# Altium footprint library AMLB_v1.PcbLib: 147 footprints (part 10 of 10)
Each footprint in its own frame and in the unit in brackets; x right, y up, seen from the top. Pads: shape width x height; smd on the part's side, far side on the other; paste and mask are expansions set on the pad; w line width, h text height; cw(c..) or ccw(c..) is an arc to the next point about the centre after c.
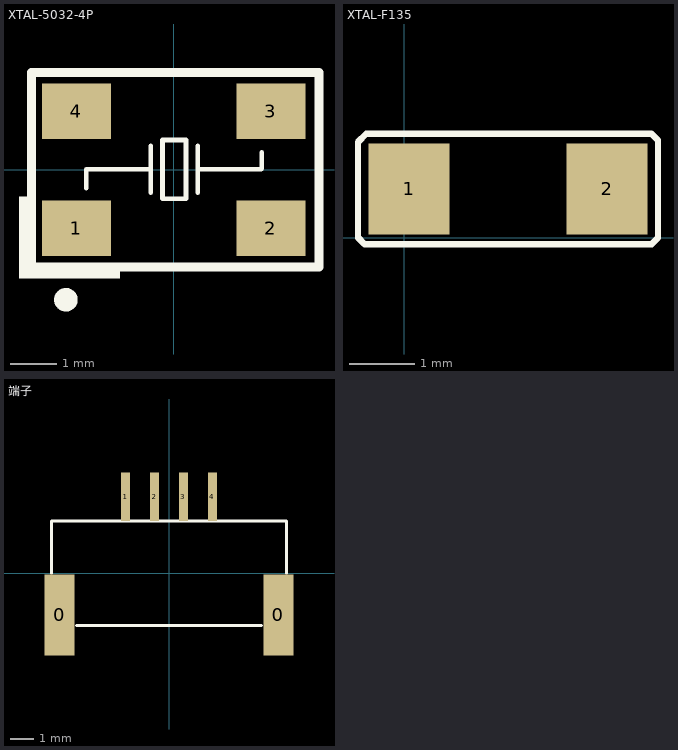
[diagram p9: the footprints below, top view; thin cyan lines are the x and y axes]

## XTAL-5032-4P [mm]
pads (4):
  rect 1.5x1.2 smd: 1(-2.108,-1.27) 2(2.108,-1.27) 3(2.108,1.27) 4(-2.108,1.27)
Top Overlay:
  circle w0.254: c-2.337,-2.819 r0.127
  rectangle: -3.353,-2.362 -3.175,-0.584
  rectangle: -3.175,-2.362 -1.168,-2.108
  lines w0.1: -1.897,-0.406 -1.897,0.008 -0.496,0.008 ; -0.496,-0.5 -0.496,0.516 ; 0.52,-0.5 0.52,0.516 ; 0.52,0.008 1.902,0.008 1.905,0.016 1.905,0.381 ; -0.242,-0.627 0.266,-0.627 0.266,-0.309 0.266,0.326 0.266,0.643 -0.242,0.643 -0.242,-0.627
  lines w0.2: -3.079,-2.108 -3.079,2.108 3.15,2.108 3.15,-2.108 -3.079,-2.108
3D body "User Library-CRYSTALSMD5X32.STEP": height 1, standoff 0, extent -2.5,-1.6 2.5,1.6

## XTAL-F135 [mm] "F135,32.758K"
height 0.762
pads (2):
  rect 1.25x1.4 smd: 1(0.075,0.75) 2(3.125,0.75)
Top Overlay:
  lines w0.1: -0.711,0.002 -0.711,1.473 -0.584,1.6 3.81,1.6 3.91,1.5 3.91,-0.001 3.812,-0.1 -0.61,-0.1 -0.711,0.002

## 端子 [mm] "4P"
pads (6):
  rect 1.3x3.5 smd: 0(-4.725,-1.8) 0(4.725,-1.8)
  rect 0.4x2.1 smd: 1(-1.875,3.3) 2(-0.625,3.3) 3(0.625,3.3) 4(1.875,3.3)
Top Overlay:
  lines w0.127: -5.08,0 -5.08,2.25 5.075,2.25 5.075,0 ; -4,-2.25 4,-2.25